# Altium schematic symbol library jlcpcb_2025_04_ferrites_extended_0603.schlib: 833 symbols (part 3 of 4) (continued)
## MAF1608GAD121LTAH0
designator FB?  Impedance @ Frequency: 20Ω@100MHz
Ferrite, 20Ω@100MHz, ±25%, 27mΩ, 3.2A, SMD 0603; Manufacturer: TDK; Manufacturer Part Number: MAF1608GAD121LTAH0; Package Size: 0603; JLCPCB Basic Part: No; JLCPCB Part Number: C2162867; Supplier 1: LCSC; Category: Ferrite Beads; Supplier Part Number 1: C2162867; Tolerance: ±25%; Rated Current: 3.2A; DC Resistance: 27mΩ; RoHS: Yes; ComponentLink1Description: Datasheet; ComponentLink1URL: https://wmsc.lcsc.com/wmsc/upload/file/pdf/v2/lcsc/2304140030_TDK-MAF1608GAD121LTAH0_C2162867.pdf; ComponentLink2Description: JLCPCB Part URL; ComponentLink2URL: https://jlcpcb.com/partdetail/C2162867; ComponentLink3Description: LCSC Part URL; ComponentLink3URL: https://lcsc.com/product-detail/Ferrite-Beads_TDK-TDK-MAF1608GAD121LTAH0_C2162867.html
footprint FB-0603 (0603 (1608M) Ferrite)
pins: 1, 2

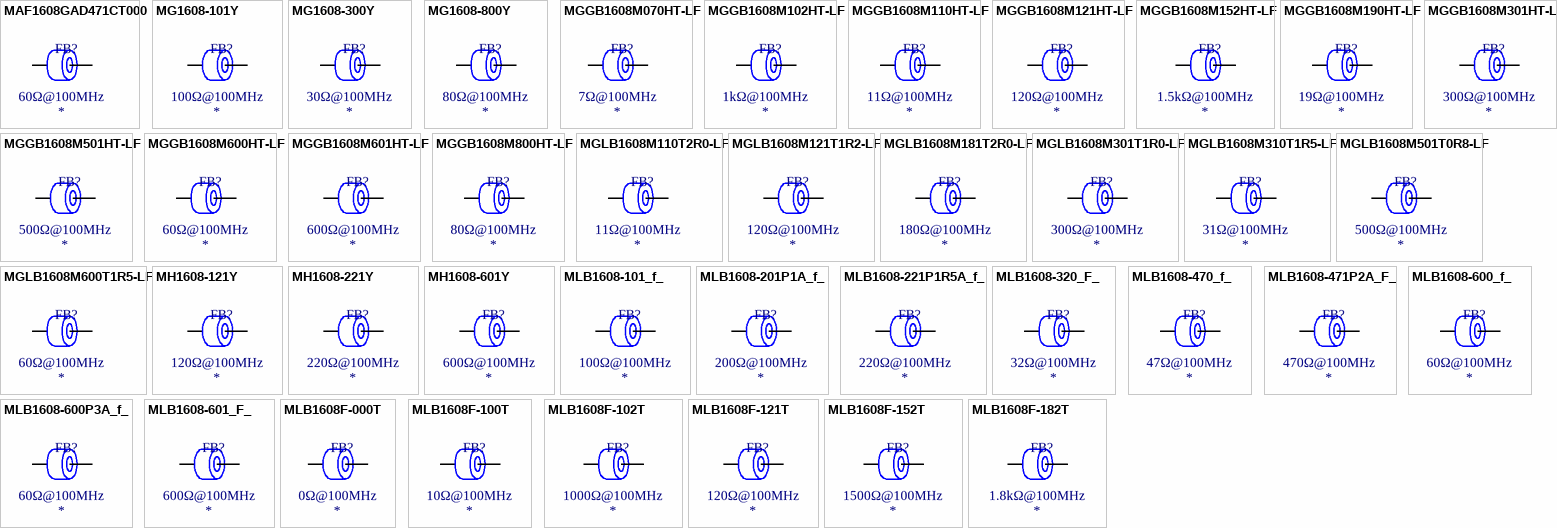
[diagram p13: symbols MAF1608GAD471CT000 to MLB1608F-182T]

## MAF1608GAD471CT000
designator FB?  Impedance @ Frequency: 60Ω@100MHz
Ferrite, 60Ω@100MHz, ±25%, 75mΩ, 1.6A, SMD 0603; Manufacturer: TDK; Manufacturer Part Number: MAF1608GAD471CT000; Package Size: 0603; JLCPCB Basic Part: No; JLCPCB Part Number: C307687; Supplier 1: LCSC; Category: Ferrite Beads; Supplier Part Number 1: C307687; Tolerance: ±25%; Rated Current: 1.6A; DC Resistance: 75mΩ; RoHS: Yes; ComponentLink1Description: Datasheet; ComponentLink1URL: https://wmsc.lcsc.com/wmsc/upload/file/pdf/v2/lcsc/1811131733_TDK-MAF1608GAD471CT000_C307687.pdf; ComponentLink2Description: JLCPCB Part URL; ComponentLink2URL: https://jlcpcb.com/partdetail/C307687; ComponentLink3Description: LCSC Part URL; ComponentLink3URL: https://lcsc.com/product-detail/Ferrite-Beads_TDK-TDK-MAF1608GAD471CT000_C307687.html
footprint FB-0603 (0603 (1608M) Ferrite)
pins: 1, 2

## MG1608-101Y
designator FB?  Impedance @ Frequency: 100Ω@100MHz
Ferrite, 100Ω@100MHz, ±25%, 0.25Ω, 200mA, SMD 0603; Manufacturer: BOURNS; Manufacturer Part Number: MG1608-101Y; Package Size: 0603; JLCPCB Basic Part: No; JLCPCB Part Number: C139459; Supplier 1: LCSC; Category: Ferrite Beads; Supplier Part Number 1: C139459; Tolerance: ±25%; Rated Current: 200mA; DC Resistance: 0.25Ω; RoHS: Yes; ComponentLink1Description: Datasheet; ComponentLink1URL: https://wmsc.lcsc.com/wmsc/upload/file/pdf/v2/lcsc/2304140030_BOURNS-MG1608-101Y_C139459.pdf; ComponentLink2Description: JLCPCB Part URL; ComponentLink2URL: https://jlcpcb.com/partdetail/C139459; ComponentLink3Description: LCSC Part URL; ComponentLink3URL: https://lcsc.com/product-detail/Ferrite-Beads_BOURNS-BOURNS-MG1608-101Y_C139459.html
footprint FB-0603 (0603 (1608M) Ferrite)
pins: 1, 2

## MG1608-300Y
designator FB?  Impedance @ Frequency: 30Ω@100MHz
Ferrite, 30Ω@100MHz, ±25%, 0.2Ω, 200mA, SMD 0603; Manufacturer: BOURNS; Manufacturer Part Number: MG1608-300Y; Package Size: 0603; JLCPCB Basic Part: No; JLCPCB Part Number: C139460; Supplier 1: LCSC; Category: Ferrite Beads; Supplier Part Number 1: C139460; Tolerance: ±25%; Rated Current: 200mA; DC Resistance: 0.2Ω; RoHS: Yes; ComponentLink1Description: Datasheet; ComponentLink1URL: https://wmsc.lcsc.com/wmsc/upload/file/pdf/v2/lcsc/2304140030_BOURNS-MG1608-300Y_C139460.pdf; ComponentLink2Description: JLCPCB Part URL; ComponentLink2URL: https://jlcpcb.com/partdetail/C139460; ComponentLink3Description: LCSC Part URL; ComponentLink3URL: https://lcsc.com/product-detail/Ferrite-Beads_BOURNS-BOURNS-MG1608-300Y_C139460.html
footprint FB-0603 (0603 (1608M) Ferrite)
pins: 1, 2

## MG1608-800Y
designator FB?  Impedance @ Frequency: 80Ω@100MHz
Ferrite, 80Ω@100MHz, ±25%, 0.3Ω, 300mA, SMD 0603; Manufacturer: BOURNS; Manufacturer Part Number: MG1608-800Y; Package Size: 0603; JLCPCB Basic Part: No; JLCPCB Part Number: C139461; Supplier 1: LCSC; Category: Ferrite Beads; Supplier Part Number 1: C139461; Tolerance: ±25%; Rated Current: 300mA; DC Resistance: 0.3Ω; RoHS: Yes; ComponentLink1Description: Datasheet; ComponentLink1URL: https://wmsc.lcsc.com/wmsc/upload/file/pdf/v2/lcsc/2304140030_BOURNS-MG1608-800Y_C139461.pdf; ComponentLink2Description: JLCPCB Part URL; ComponentLink2URL: https://jlcpcb.com/partdetail/C139461; ComponentLink3Description: LCSC Part URL; ComponentLink3URL: https://lcsc.com/product-detail/Ferrite-Beads_BOURNS-BOURNS-MG1608-800Y_C139461.html
footprint FB-0603 (0603 (1608M) Ferrite)
pins: 1, 2

## MGGB1608M070HT-LF
designator FB?  Impedance @ Frequency: 7Ω@100MHz
Ferrite, 7Ω@100MHz, ±25%, 0.05Ω, 1000mA, SMD 0603; Manufacturer: microgate; Manufacturer Part Number: MGGB1608M070HT-LF; Package Size: 0603; JLCPCB Basic Part: No; JLCPCB Part Number: C281138; Supplier 1: LCSC; Category: Ferrite Beads; Supplier Part Number 1: C281138; Tolerance: ±25%; Rated Current: 1000mA; DC Resistance: 0.05Ω; RoHS: Yes; ComponentLink1Description: Datasheet; ComponentLink1URL: https://wmsc.lcsc.com/wmsc/upload/file/pdf/v2/lcsc/2304140030_microgate-MGGB1608M070HT-LF_C281138.pdf; ComponentLink2Description: JLCPCB Part URL; ComponentLink2URL: https://jlcpcb.com/partdetail/C281138; ComponentLink3Description: LCSC Part URL; ComponentLink3URL: https://lcsc.com/product-detail/Ferrite-Beads_microgate-microgate-MGGB1608M070HT-LF_C281138.html
footprint FB-0603 (0603 (1608M) Ferrite)
pins: 1, 2

## MGGB1608M102HT-LF
designator FB?  Impedance @ Frequency: 1kΩ@100MHz
Ferrite, 1kΩ@100MHz, ±25%, 0.6Ω, 100mA, SMD 0603; Manufacturer: microgate; Manufacturer Part Number: MGGB1608M102HT-LF; Package Size: 0603; JLCPCB Basic Part: No; JLCPCB Part Number: C281139; Supplier 1: LCSC; Category: Ferrite Beads; Supplier Part Number 1: C281139; Tolerance: ±25%; Rated Current: 100mA; DC Resistance: 0.6Ω; RoHS: Yes; ComponentLink1Description: Datasheet; ComponentLink1URL: https://wmsc.lcsc.com/wmsc/upload/file/pdf/v2/lcsc/2304140030_microgate-MGGB1608M102HT-LF_C281139.pdf; ComponentLink2Description: JLCPCB Part URL; ComponentLink2URL: https://jlcpcb.com/partdetail/C281139; ComponentLink3Description: LCSC Part URL; ComponentLink3URL: https://lcsc.com/product-detail/Ferrite-Beads_microgate-microgate-MGGB1608M102HT-LF_C281139.html
footprint FB-0603 (0603 (1608M) Ferrite)
pins: 1, 2

## MGGB1608M110HT-LF
designator FB?  Impedance @ Frequency: 11Ω@100MHz
Ferrite, 11Ω@100MHz, ±25%, 0.05Ω, 1000mA, SMD 0603; Manufacturer: microgate; Manufacturer Part Number: MGGB1608M110HT-LF; Package Size: 0603; JLCPCB Basic Part: No; JLCPCB Part Number: C281140; Supplier 1: LCSC; Category: Ferrite Beads; Supplier Part Number 1: C281140; Tolerance: ±25%; Rated Current: 1000mA; DC Resistance: 0.05Ω; RoHS: Yes; ComponentLink1Description: Datasheet; ComponentLink1URL: https://wmsc.lcsc.com/wmsc/upload/file/pdf/v2/lcsc/2304140030_microgate-MGGB1608M110HT-LF_C281140.pdf; ComponentLink2Description: JLCPCB Part URL; ComponentLink2URL: https://jlcpcb.com/partdetail/C281140; ComponentLink3Description: LCSC Part URL; ComponentLink3URL: https://lcsc.com/product-detail/Ferrite-Beads_microgate-microgate-MGGB1608M110HT-LF_C281140.html
footprint FB-0603 (0603 (1608M) Ferrite)
pins: 1, 2

## MGGB1608M121HT-LF
designator FB?  Impedance @ Frequency: 120Ω@100MHz
Ferrite, 120Ω@100MHz, ±25%, 0.2Ω, 200mA, SMD 0603; Manufacturer: microgate; Manufacturer Part Number: MGGB1608M121HT-LF; Package Size: 0603; JLCPCB Basic Part: No; JLCPCB Part Number: C281141; Supplier 1: LCSC; Category: Ferrite Beads; Supplier Part Number 1: C281141; Tolerance: ±25%; Rated Current: 200mA; DC Resistance: 0.2Ω; RoHS: Yes; ComponentLink1Description: Datasheet; ComponentLink1URL: https://wmsc.lcsc.com/wmsc/upload/file/pdf/v2/lcsc/2304140030_microgate-MGGB1608M121HT-LF_C281141.pdf; ComponentLink2Description: JLCPCB Part URL; ComponentLink2URL: https://jlcpcb.com/partdetail/C281141; ComponentLink3Description: LCSC Part URL; ComponentLink3URL: https://lcsc.com/product-detail/Ferrite-Beads_microgate-microgate-MGGB1608M121HT-LF_C281141.html
footprint FB-0603 (0603 (1608M) Ferrite)
pins: 1, 2

## MGGB1608M152HT-LF
designator FB?  Impedance @ Frequency: 1.5kΩ@100MHz
Ferrite, 1.5kΩ@100MHz, ±25%, 0.8Ω, 100mA, SMD 0603; Manufacturer: microgate; Manufacturer Part Number: MGGB1608M152HT-LF; Package Size: 0603; JLCPCB Basic Part: No; JLCPCB Part Number: C281142; Supplier 1: LCSC; Category: Ferrite Beads; Supplier Part Number 1: C281142; Tolerance: ±25%; Rated Current: 100mA; DC Resistance: 0.8Ω; RoHS: Yes; ComponentLink1Description: Datasheet; ComponentLink1URL: https://wmsc.lcsc.com/wmsc/upload/file/pdf/v2/lcsc/2304140030_microgate-MGGB1608M152HT-LF_C281142.pdf; ComponentLink2Description: JLCPCB Part URL; ComponentLink2URL: https://jlcpcb.com/partdetail/C281142; ComponentLink3Description: LCSC Part URL; ComponentLink3URL: https://lcsc.com/product-detail/Ferrite-Beads_microgate-microgate-MGGB1608M152HT-LF_C281142.html
footprint FB-0603 (0603 (1608M) Ferrite)
pins: 1, 2

## MGGB1608M190HT-LF
designator FB?  Impedance @ Frequency: 19Ω@100MHz
Ferrite, 19Ω@100MHz, ±25%, 0.05Ω, 1000mA, SMD 0603; Manufacturer: microgate; Manufacturer Part Number: MGGB1608M190HT-LF; Package Size: 0603; JLCPCB Basic Part: No; JLCPCB Part Number: C281144; Supplier 1: LCSC; Category: Ferrite Beads; Supplier Part Number 1: C281144; Tolerance: ±25%; Rated Current: 1000mA; DC Resistance: 0.05Ω; RoHS: Yes; ComponentLink1Description: Datasheet; ComponentLink1URL: https://wmsc.lcsc.com/wmsc/upload/file/pdf/v2/lcsc/2304140030_microgate-MGGB1608M190HT-LF_C281144.pdf; ComponentLink2Description: JLCPCB Part URL; ComponentLink2URL: https://jlcpcb.com/partdetail/C281144; ComponentLink3Description: LCSC Part URL; ComponentLink3URL: https://lcsc.com/product-detail/Ferrite-Beads_microgate-microgate-MGGB1608M190HT-LF_C281144.html
footprint FB-0603 (0603 (1608M) Ferrite)
pins: 1, 2

## MGGB1608M301HT-LF
designator FB?  Impedance @ Frequency: 300Ω@100MHz
Ferrite, 300Ω@100MHz, ±25%, 0.35Ω, 200mA, SMD 0603; Manufacturer: microgate; Manufacturer Part Number: MGGB1608M301HT-LF; Package Size: 0603; JLCPCB Basic Part: No; JLCPCB Part Number: C281148; Supplier 1: LCSC; Category: Ferrite Beads; Supplier Part Number 1: C281148; Tolerance: ±25%; Rated Current: 200mA; DC Resistance: 0.35Ω; RoHS: Yes; ComponentLink1Description: Datasheet; ComponentLink1URL: https://wmsc.lcsc.com/wmsc/upload/file/pdf/v2/lcsc/2304140030_microgate-MGGB1608M301HT-LF_C281148.pdf; ComponentLink2Description: JLCPCB Part URL; ComponentLink2URL: https://jlcpcb.com/partdetail/C281148; ComponentLink3Description: LCSC Part URL; ComponentLink3URL: https://lcsc.com/product-detail/Ferrite-Beads_microgate-microgate-MGGB1608M301HT-LF_C281148.html
footprint FB-0603 (0603 (1608M) Ferrite)
pins: 1, 2

## MGGB1608M501HT-LF
designator FB?  Impedance @ Frequency: 500Ω@100MHz
Ferrite, 500Ω@100MHz, ±25%, SMD 0603; Manufacturer: microgate; Manufacturer Part Number: MGGB1608M501HT-LF; Package Size: 0603; JLCPCB Basic Part: No; JLCPCB Part Number: C281149; Supplier 1: LCSC; Category: Ferrite Beads; Supplier Part Number 1: C281149; Tolerance: ±25%; RoHS: Yes; ComponentLink1Description: Datasheet; ComponentLink1URL: https://wmsc.lcsc.com/wmsc/upload/file/pdf/v2/lcsc/2304140030_microgate-MGGB1608M501HT-LF_C281149.pdf; ComponentLink2Description: JLCPCB Part URL; ComponentLink2URL: https://jlcpcb.com/partdetail/C281149; ComponentLink3Description: LCSC Part URL; ComponentLink3URL: https://lcsc.com/product-detail/Ferrite-Beads_microgate-microgate-MGGB1608M501HT-LF_C281149.html
pins: 1, 2

## MGGB1608M600HT-LF
designator FB?  Impedance @ Frequency: 60Ω@100MHz
Ferrite, 60Ω@100MHz, ±25%, 0.12Ω, 300mA, SMD 0603; Manufacturer: microgate; Manufacturer Part Number: MGGB1608M600HT-LF; Package Size: 0603; JLCPCB Basic Part: No; JLCPCB Part Number: C281150; Supplier 1: LCSC; Category: Ferrite Beads; Supplier Part Number 1: C281150; Tolerance: ±25%; Rated Current: 300mA; DC Resistance: 0.12Ω; RoHS: Yes; ComponentLink1Description: Datasheet; ComponentLink1URL: https://wmsc.lcsc.com/wmsc/upload/file/pdf/v2/lcsc/2304140030_microgate-MGGB1608M600HT-LF_C281150.pdf; ComponentLink2Description: JLCPCB Part URL; ComponentLink2URL: https://jlcpcb.com/partdetail/C281150; ComponentLink3Description: LCSC Part URL; ComponentLink3URL: https://lcsc.com/product-detail/Ferrite-Beads_microgate-microgate-MGGB1608M600HT-LF_C281150.html
footprint FB-0603 (0603 (1608M) Ferrite)
pins: 1, 2

## MGGB1608M601HT-LF
designator FB?  Impedance @ Frequency: 600Ω@100MHz
Ferrite, 600Ω@100MHz, ±25%, 0.5Ω, 200mA, SMD 0603; Manufacturer: microgate; Manufacturer Part Number: MGGB1608M601HT-LF; Package Size: 0603; JLCPCB Basic Part: No; JLCPCB Part Number: C281151; Supplier 1: LCSC; Category: Ferrite Beads; Supplier Part Number 1: C281151; Tolerance: ±25%; Rated Current: 200mA; DC Resistance: 0.5Ω; RoHS: Yes; ComponentLink1Description: Datasheet; ComponentLink1URL: https://wmsc.lcsc.com/wmsc/upload/file/pdf/v2/lcsc/2304140030_microgate-MGGB1608M601HT-LF_C281151.pdf; ComponentLink2Description: JLCPCB Part URL; ComponentLink2URL: https://jlcpcb.com/partdetail/C281151; ComponentLink3Description: LCSC Part URL; ComponentLink3URL: https://lcsc.com/product-detail/Ferrite-Beads_microgate-microgate-MGGB1608M601HT-LF_C281151.html
footprint FB-0603 (0603 (1608M) Ferrite)
pins: 1, 2

## MGGB1608M800HT-LF
designator FB?  Impedance @ Frequency: 80Ω@100MHz
Ferrite, 80Ω@100MHz, ±25%, 0.16Ω, 200mA, SMD 0603; Manufacturer: microgate; Manufacturer Part Number: MGGB1608M800HT-LF; Package Size: 0603; JLCPCB Basic Part: No; JLCPCB Part Number: C281152; Supplier 1: LCSC; Category: Ferrite Beads; Supplier Part Number 1: C281152; Tolerance: ±25%; Rated Current: 200mA; DC Resistance: 0.16Ω; RoHS: Yes; ComponentLink1Description: Datasheet; ComponentLink1URL: https://wmsc.lcsc.com/wmsc/upload/file/pdf/v2/lcsc/2304140030_microgate-MGGB1608M800HT-LF_C281152.pdf; ComponentLink2Description: JLCPCB Part URL; ComponentLink2URL: https://jlcpcb.com/partdetail/C281152; ComponentLink3Description: LCSC Part URL; ComponentLink3URL: https://lcsc.com/product-detail/Ferrite-Beads_microgate-microgate-MGGB1608M800HT-LF_C281152.html
footprint FB-0603 (0603 (1608M) Ferrite)
pins: 1, 2

## MGLB1608M110T2R0-LF
designator FB?  Impedance @ Frequency: 11Ω@100MHz
Ferrite, 11Ω@100MHz, ±25%, 30mΩ, 2A, SMD 0603; Manufacturer: microgate; Manufacturer Part Number: MGLB1608M110T2R0-LF; Package Size: 0603; JLCPCB Basic Part: No; JLCPCB Part Number: C281201; Supplier 1: LCSC; Category: Ferrite Beads; Supplier Part Number 1: C281201; Tolerance: ±25%; Rated Current: 2A; DC Resistance: 30mΩ; RoHS: Yes; ComponentLink1Description: Datasheet; ComponentLink1URL: https://wmsc.lcsc.com/wmsc/upload/file/pdf/v2/lcsc/2304140030_microgate-MGLB1608M110T2R0-LF_C281201.pdf; ComponentLink2Description: JLCPCB Part URL; ComponentLink2URL: https://jlcpcb.com/partdetail/C281201; ComponentLink3Description: LCSC Part URL; ComponentLink3URL: https://lcsc.com/product-detail/Ferrite-Beads_microgate-microgate-MGLB1608M110T2R0-LF_C281201.html
footprint FB-0603 (0603 (1608M) Ferrite)
pins: 1, 2

## MGLB1608M121T1R2-LF
designator FB?  Impedance @ Frequency: 120Ω@100MHz
Ferrite, 120Ω@100MHz, ±25%, 100mΩ, 1.2A, SMD 0603; Manufacturer: microgate; Manufacturer Part Number: MGLB1608M121T1R2-LF; Package Size: 0603; JLCPCB Basic Part: No; JLCPCB Part Number: C281202; Supplier 1: LCSC; Category: Ferrite Beads; Supplier Part Number 1: C281202; Tolerance: ±25%; Rated Current: 1.2A; DC Resistance: 100mΩ; RoHS: Yes; ComponentLink1Description: Datasheet; ComponentLink1URL: https://wmsc.lcsc.com/wmsc/upload/file/pdf/v2/lcsc/2304140030_microgate-MGLB1608M121T1R2-LF_C281202.pdf; ComponentLink2Description: JLCPCB Part URL; ComponentLink2URL: https://jlcpcb.com/partdetail/C281202; ComponentLink3Description: LCSC Part URL; ComponentLink3URL: https://lcsc.com/product-detail/Ferrite-Beads_microgate-microgate-MGLB1608M121T1R2-LF_C281202.html
footprint FB-0603 (0603 (1608M) Ferrite)
pins: 1, 2

## MGLB1608M181T2R0-LF
designator FB?  Impedance @ Frequency: 180Ω@100MHz
Ferrite, 180Ω@100MHz, ±25%, 2A, SMD 0603; Manufacturer: microgate; Manufacturer Part Number: MGLB1608M181T2R0-LF; Package Size: 0603; JLCPCB Basic Part: No; JLCPCB Part Number: C281203; Supplier 1: LCSC; Category: Ferrite Beads; Supplier Part Number 1: C281203; Tolerance: ±25%; Rated Current: 2A; RoHS: Yes; ComponentLink1Description: Datasheet; ComponentLink1URL: https://wmsc.lcsc.com/wmsc/upload/file/pdf/v2/lcsc/2304140030_microgate-MGLB1608M181T2R0-LF_C281203.pdf; ComponentLink2Description: JLCPCB Part URL; ComponentLink2URL: https://jlcpcb.com/partdetail/C281203; ComponentLink3Description: LCSC Part URL; ComponentLink3URL: https://lcsc.com/product-detail/Ferrite-Beads_microgate-microgate-MGLB1608M181T2R0-LF_C281203.html
pins: 1, 2

## MGLB1608M301T1R0-LF
designator FB?  Impedance @ Frequency: 300Ω@100MHz
Ferrite, 300Ω@100MHz, ±25%, 200mΩ, 1A, SMD 0603; Manufacturer: microgate; Manufacturer Part Number: MGLB1608M301T1R0-LF; Package Size: 0603; JLCPCB Basic Part: No; JLCPCB Part Number: C281205; Supplier 1: LCSC; Category: Ferrite Beads; Supplier Part Number 1: C281205; Tolerance: ±25%; Rated Current: 1A; DC Resistance: 200mΩ; RoHS: Yes; ComponentLink1Description: Datasheet; ComponentLink1URL: https://wmsc.lcsc.com/wmsc/upload/file/pdf/v2/lcsc/2304140030_microgate-MGLB1608M301T1R0-LF_C281205.pdf; ComponentLink2Description: JLCPCB Part URL; ComponentLink2URL: https://jlcpcb.com/partdetail/C281205; ComponentLink3Description: LCSC Part URL; ComponentLink3URL: https://lcsc.com/product-detail/Ferrite-Beads_microgate-microgate-MGLB1608M301T1R0-LF_C281205.html
footprint FB-0603 (0603 (1608M) Ferrite)
pins: 1, 2

## MGLB1608M310T1R5-LF
designator FB?  Impedance @ Frequency: 31Ω@100MHz
Ferrite, 31Ω@100MHz, ±25%, 50mΩ, 1.5A, SMD 0603; Manufacturer: microgate; Manufacturer Part Number: MGLB1608M310T1R5-LF; Package Size: 0603; JLCPCB Basic Part: No; JLCPCB Part Number: C281206; Supplier 1: LCSC; Category: Ferrite Beads; Supplier Part Number 1: C281206; Tolerance: ±25%; Rated Current: 1.5A; DC Resistance: 50mΩ; RoHS: Yes; ComponentLink1Description: Datasheet; ComponentLink1URL: https://wmsc.lcsc.com/wmsc/upload/file/pdf/v2/lcsc/2304140030_microgate-MGLB1608M310T1R5-LF_C281206.pdf; ComponentLink2Description: JLCPCB Part URL; ComponentLink2URL: https://jlcpcb.com/partdetail/C281206; ComponentLink3Description: LCSC Part URL; ComponentLink3URL: https://lcsc.com/product-detail/Ferrite-Beads_microgate-microgate-MGLB1608M310T1R5-LF_C281206.html
footprint FB-0603 (0603 (1608M) Ferrite)
pins: 1, 2

## MGLB1608M501T0R8-LF
designator FB?  Impedance @ Frequency: 500Ω@100MHz
Ferrite, 500Ω@100MHz, ±25%, 280mΩ, 800mA, SMD 0603; Manufacturer: microgate; Manufacturer Part Number: MGLB1608M501T0R8-LF; Package Size: 0603; JLCPCB Basic Part: No; JLCPCB Part Number: C281207; Supplier 1: LCSC; Category: Ferrite Beads; Supplier Part Number 1: C281207; Tolerance: ±25%; Rated Current: 800mA; DC Resistance: 280mΩ; RoHS: Yes; ComponentLink1Description: Datasheet; ComponentLink1URL: https://wmsc.lcsc.com/wmsc/upload/file/pdf/v2/lcsc/2304140030_microgate-MGLB1608M501T0R8-LF_C281207.pdf; ComponentLink2Description: JLCPCB Part URL; ComponentLink2URL: https://jlcpcb.com/partdetail/C281207; ComponentLink3Description: LCSC Part URL; ComponentLink3URL: https://lcsc.com/product-detail/Ferrite-Beads_microgate-microgate-MGLB1608M501T0R8-LF_C281207.html
footprint FB-0603 (0603 (1608M) Ferrite)
pins: 1, 2

## MGLB1608M600T1R5-LF
designator FB?  Impedance @ Frequency: 60Ω@100MHz
Ferrite, 60Ω@100MHz, ±25%, 80mΩ, 1.5A, SMD 0603; Manufacturer: microgate; Manufacturer Part Number: MGLB1608M600T1R5-LF; Package Size: 0603; JLCPCB Basic Part: No; JLCPCB Part Number: C281208; Supplier 1: LCSC; Category: Ferrite Beads; Supplier Part Number 1: C281208; Tolerance: ±25%; Rated Current: 1.5A; DC Resistance: 80mΩ; RoHS: Yes; ComponentLink1Description: Datasheet; ComponentLink1URL: https://wmsc.lcsc.com/wmsc/upload/file/pdf/v2/lcsc/2304140030_microgate-MGLB1608M600T1R5-LF_C281208.pdf; ComponentLink2Description: JLCPCB Part URL; ComponentLink2URL: https://jlcpcb.com/partdetail/C281208; ComponentLink3Description: LCSC Part URL; ComponentLink3URL: https://lcsc.com/product-detail/Ferrite-Beads_microgate-microgate-MGLB1608M600T1R5-LF_C281208.html
footprint FB-0603 (0603 (1608M) Ferrite)
pins: 1, 2

## MH1608-121Y
designator FB?  Impedance @ Frequency: 120Ω@100MHz
Ferrite, 120Ω@100MHz, ±25%, 100mΩ, 2A, SMD 0603; Manufacturer: BOURNS; Manufacturer Part Number: MH1608-121Y; Package Size: 0603; JLCPCB Basic Part: No; JLCPCB Part Number: C2650949; Supplier 1: LCSC; Category: Ferrite Beads; Supplier Part Number 1: C2650949; Tolerance: ±25%; Rated Current: 2A; DC Resistance: 100mΩ; RoHS: Yes; ComponentLink1Description: Datasheet; ComponentLink1URL: https://wmsc.lcsc.com/wmsc/upload/file/pdf/v2/lcsc/2304140030_BOURNS-MH1608-121Y_C2650949.pdf; ComponentLink2Description: JLCPCB Part URL; ComponentLink2URL: https://jlcpcb.com/partdetail/C2650949; ComponentLink3Description: LCSC Part URL; ComponentLink3URL: https://lcsc.com/product-detail/Ferrite-Beads_BOURNS-BOURNS-MH1608-121Y_C2650949.html
footprint FB-0603 (0603 (1608M) Ferrite)
pins: 1, 2

## MH1608-221Y
designator FB?  Impedance @ Frequency: 220Ω@100MHz
Ferrite, 220Ω@100MHz, ±25%, 100mΩ, 2A, SMD 0603; Manufacturer: BOURNS; Manufacturer Part Number: MH1608-221Y; Package Size: 0603; JLCPCB Basic Part: No; JLCPCB Part Number: C780187; Supplier 1: LCSC; Category: Ferrite Beads; Supplier Part Number 1: C780187; Tolerance: ±25%; Rated Current: 2A; DC Resistance: 100mΩ; RoHS: Yes; ComponentLink1Description: Datasheet; ComponentLink1URL: https://wmsc.lcsc.com/wmsc/upload/file/pdf/v2/lcsc/2304140030_BOURNS-MH1608-221Y_C780187.pdf; ComponentLink2Description: JLCPCB Part URL; ComponentLink2URL: https://jlcpcb.com/partdetail/C780187; ComponentLink3Description: LCSC Part URL; ComponentLink3URL: https://lcsc.com/product-detail/Ferrite-Beads_BOURNS-BOURNS-MH1608-221Y_C780187.html
footprint FB-0603 (0603 (1608M) Ferrite)
pins: 1, 2

## MH1608-601Y
designator FB?  Impedance @ Frequency: 600Ω@100MHz
Ferrite, 600Ω@100MHz, ±25%, 200mΩ, 1A, SMD 0603; Manufacturer: BOURNS; Manufacturer Part Number: MH1608-601Y; Package Size: 0603; JLCPCB Basic Part: No; JLCPCB Part Number: C780186; Supplier 1: LCSC; Category: Ferrite Beads; Supplier Part Number 1: C780186; Tolerance: ±25%; Rated Current: 1A; DC Resistance: 200mΩ; RoHS: Yes; ComponentLink1Description: Datasheet; ComponentLink1URL: https://wmsc.lcsc.com/wmsc/upload/file/pdf/v2/lcsc/2304140030_BOURNS-MH1608-601Y_C780186.pdf; ComponentLink2Description: JLCPCB Part URL; ComponentLink2URL: https://jlcpcb.com/partdetail/C780186; ComponentLink3Description: LCSC Part URL; ComponentLink3URL: https://lcsc.com/product-detail/Ferrite-Beads_BOURNS-BOURNS-MH1608-601Y_C780186.html
footprint FB-0603 (0603 (1608M) Ferrite)
pins: 1, 2

## MLB1608-101_f_
designator FB?  Impedance @ Frequency: 100Ω@100MHz
Ferrite, 100Ω@100MHz, ±25%, 200mΩ, 300mA, SMD 0603; Manufacturer: Meled; Manufacturer Part Number: MLB1608-101(f); Package Size: 0603; JLCPCB Basic Part: No; JLCPCB Part Number: C8220; Supplier 1: LCSC; Category: Ferrite Beads; Supplier Part Number 1: C8220; Tolerance: ±25%; Rated Current: 300mA; DC Resistance: 200mΩ; RoHS: Yes; ComponentLink1Description: Datasheet; ComponentLink1URL: https://wmsc.lcsc.com/wmsc/upload/file/pdf/v2/lcsc/1811111110_MetalLions-MLB1608-101-f_C8220.pdf; ComponentLink2Description: JLCPCB Part URL; ComponentLink2URL: https://jlcpcb.com/partdetail/C8220; ComponentLink3Description: LCSC Part URL; ComponentLink3URL: https://lcsc.com/product-detail/Ferrite-Beads_Meled-Meled-MLB1608-101f_C8220.html
footprint FB-0603 (0603 (1608M) Ferrite)
pins: 1, 2

## MLB1608-201P1A_f_
designator FB?  Impedance @ Frequency: 200Ω@100MHz
Ferrite, 200Ω@100MHz, ±25%, 300mΩ, 1A, SMD 0603; Manufacturer: Meled; Manufacturer Part Number: MLB1608-201P1A(f); Package Size: 0603; JLCPCB Basic Part: No; JLCPCB Part Number: C45316; Supplier 1: LCSC; Category: Ferrite Beads; Supplier Part Number 1: C45316; Tolerance: ±25%; Rated Current: 1A; DC Resistance: 300mΩ; RoHS: Yes; ComponentLink1Description: Datasheet; ComponentLink1URL: https://wmsc.lcsc.com/wmsc/upload/file/pdf/v2/lcsc/1809191819_MetalLions-MLB1608-201P1A-f_C45316.pdf; ComponentLink2Description: JLCPCB Part URL; ComponentLink2URL: https://jlcpcb.com/partdetail/C45316; ComponentLink3Description: LCSC Part URL; ComponentLink3URL: https://lcsc.com/product-detail/Ferrite-Beads_Meled-Meled-MLB1608-201P1Af_C45316.html
footprint FB-0603 (0603 (1608M) Ferrite)
pins: 1, 2

## MLB1608-221P1R5A_f_
designator FB?  Impedance @ Frequency: 220Ω@100MHz
Ferrite, 220Ω@100MHz, ±25%, 100mΩ, 1.5A, SMD 0603; Manufacturer: Meled; Manufacturer Part Number: MLB1608-221P1R5A(f); Package Size: 0603; JLCPCB Basic Part: No; JLCPCB Part Number: C47131; Supplier 1: LCSC; Category: Ferrite Beads; Supplier Part Number 1: C47131; Tolerance: ±25%; Rated Current: 1.5A; DC Resistance: 100mΩ; RoHS: Yes; ComponentLink1Description: Datasheet; ComponentLink1URL: https://wmsc.lcsc.com/wmsc/upload/file/pdf/v2/lcsc/1809191911_MetalLions-MLB1608-221P1R5A-f_C47131.pdf; ComponentLink2Description: JLCPCB Part URL; ComponentLink2URL: https://jlcpcb.com/partdetail/C47131; ComponentLink3Description: LCSC Part URL; ComponentLink3URL: https://lcsc.com/product-detail/Ferrite-Beads_Meled-Meled-MLB1608-221P1R5Af_C47131.html
footprint FB-0603 (0603 (1608M) Ferrite)
pins: 1, 2

## MLB1608-320_F_
designator FB?  Impedance @ Frequency: 32Ω@100MHz
Ferrite, 32Ω@100MHz, ±25%, 50mΩ, 500mA, SMD 0603; Manufacturer: Meled; Manufacturer Part Number: MLB1608-320(F); Package Size: 0603; JLCPCB Basic Part: No; JLCPCB Part Number: C24589; Supplier 1: LCSC; Category: Ferrite Beads; Supplier Part Number 1: C24589; Tolerance: ±25%; Rated Current: 500mA; DC Resistance: 50mΩ; RoHS: Yes; ComponentLink1Description: Datasheet; ComponentLink1URL: https://wmsc.lcsc.com/wmsc/upload/file/pdf/v2/lcsc/1809140110_MetalLions-MLB1608-320-F_C24589.pdf; ComponentLink2Description: JLCPCB Part URL; ComponentLink2URL: https://jlcpcb.com/partdetail/C24589; ComponentLink3Description: LCSC Part URL; ComponentLink3URL: https://lcsc.com/product-detail/Ferrite-Beads_Meled-Meled-MLB1608-320F_C24589.html
footprint FB-0603 (0603 (1608M) Ferrite)
pins: 1, 2

## MLB1608-470_f_
designator FB?  Impedance @ Frequency: 47Ω@100MHz
Ferrite, 47Ω@100MHz, ±25%, 50mΩ, 500mA, SMD 0603; Manufacturer: Meled; Manufacturer Part Number: MLB1608-470(f); Package Size: 0603; JLCPCB Basic Part: No; JLCPCB Part Number: C53139; Supplier 1: LCSC; Category: Ferrite Beads; Supplier Part Number 1: C53139; Tolerance: ±25%; Rated Current: 500mA; DC Resistance: 50mΩ; RoHS: Yes; ComponentLink1Description: Datasheet; ComponentLink1URL: https://wmsc.lcsc.com/wmsc/upload/file/pdf/v2/lcsc/1809140010_MetalLions-MLB1608-470-f_C53139.pdf; ComponentLink2Description: JLCPCB Part URL; ComponentLink2URL: https://jlcpcb.com/partdetail/C53139; ComponentLink3Description: LCSC Part URL; ComponentLink3URL: https://lcsc.com/product-detail/Ferrite-Beads_Meled-Meled-MLB1608-470f-_C53139.html
footprint FB-0603 (0603 (1608M) Ferrite)
pins: 1, 2

## MLB1608-471P2A_F_
designator FB?  Impedance @ Frequency: 470Ω@100MHz
Ferrite, 470Ω@100MHz, ±25%, 450mΩ, 2A, SMD 0603; Manufacturer: Meled; Manufacturer Part Number: MLB1608-471P2A(F); Package Size: 0603; JLCPCB Basic Part: No; JLCPCB Part Number: C24705; Supplier 1: LCSC; Category: Ferrite Beads; Supplier Part Number 1: C24705; Tolerance: ±25%; Rated Current: 2A; DC Resistance: 450mΩ; RoHS: Yes; ComponentLink1Description: Datasheet; ComponentLink1URL: https://wmsc.lcsc.com/wmsc/upload/file/pdf/v2/lcsc/1809301812_MetalLions-MLB1608-471P2A-F_C24705.pdf; ComponentLink2Description: JLCPCB Part URL; ComponentLink2URL: https://jlcpcb.com/partdetail/C24705; ComponentLink3Description: LCSC Part URL; ComponentLink3URL: https://lcsc.com/product-detail/Ferrite-Beads_Meled-Meled-MLB1608-471P2AF_C24705.html
footprint FB-0603 (0603 (1608M) Ferrite)
pins: 1, 2

## MLB1608-600_f_
designator FB?  Impedance @ Frequency: 60Ω@100MHz
Ferrite, 60Ω@100MHz, ±25%, 80mΩ, 500mA, SMD 0603; Manufacturer: Meled; Manufacturer Part Number: MLB1608-600(f); Package Size: 0603; JLCPCB Basic Part: No; JLCPCB Part Number: C46786; Supplier 1: LCSC; Category: Ferrite Beads; Supplier Part Number 1: C46786; Tolerance: ±25%; Rated Current: 500mA; DC Resistance: 80mΩ; RoHS: Yes; ComponentLink1Description: Datasheet; ComponentLink1URL: https://wmsc.lcsc.com/wmsc/upload/file/pdf/v2/lcsc/1809140032_MetalLions-MLB1608-600-f_C46786.pdf; ComponentLink2Description: JLCPCB Part URL; ComponentLink2URL: https://jlcpcb.com/partdetail/C46786; ComponentLink3Description: LCSC Part URL; ComponentLink3URL: https://lcsc.com/product-detail/Ferrite-Beads_Meled-Meled-MLB1608-600f_C46786.html
footprint FB-0603 (0603 (1608M) Ferrite)
pins: 1, 2

## MLB1608-600P3A_f_
designator FB?  Impedance @ Frequency: 60Ω@100MHz
Ferrite, 60Ω@100MHz, ±25%, 80mΩ, 3A, SMD 0603; Manufacturer: Meled; Manufacturer Part Number: MLB1608-600P3A(f); Package Size: 0603; JLCPCB Basic Part: No; JLCPCB Part Number: C52283; Supplier 1: LCSC; Category: Ferrite Beads; Supplier Part Number 1: C52283; Tolerance: ±25%; Rated Current: 3A; DC Resistance: 80mΩ; RoHS: Yes; ComponentLink1Description: Datasheet; ComponentLink1URL: https://wmsc.lcsc.com/wmsc/upload/file/pdf/v2/lcsc/1809212124_MetalLions-MLB1608-600P3A-f_C52283.pdf; ComponentLink2Description: JLCPCB Part URL; ComponentLink2URL: https://jlcpcb.com/partdetail/C52283; ComponentLink3Description: LCSC Part URL; ComponentLink3URL: https://lcsc.com/product-detail/Ferrite-Beads_Meled-Meled-MLB1608-600P3Af-_C52283.html
footprint FB-0603 (0603 (1608M) Ferrite)
pins: 1, 2

## MLB1608-601_F_
designator FB?  Impedance @ Frequency: 600Ω@100MHz
Ferrite, 600Ω@100MHz, ±25%, 450mΩ, 200mA, SMD 0603; Manufacturer: Meled; Manufacturer Part Number: MLB1608-601(F); Package Size: 0603; JLCPCB Basic Part: No; JLCPCB Part Number: C29108; Supplier 1: LCSC; Category: Ferrite Beads; Supplier Part Number 1: C29108; Tolerance: ±25%; Rated Current: 200mA; DC Resistance: 450mΩ; RoHS: Yes; ComponentLink1Description: Datasheet; ComponentLink1URL: https://wmsc.lcsc.com/wmsc/upload/file/pdf/v2/lcsc/1811131630_MetalLions-MLB1608-601-F_C29108.pdf; ComponentLink2Description: JLCPCB Part URL; ComponentLink2URL: https://jlcpcb.com/partdetail/C29108; ComponentLink3Description: LCSC Part URL; ComponentLink3URL: https://lcsc.com/product-detail/Ferrite-Beads_Meled-Meled-MLB1608-601F_C29108.html
footprint FB-0603 (0603 (1608M) Ferrite)
pins: 1, 2

## MLB1608F-000T
designator FB?  Impedance @ Frequency: 0Ω@100MHz
Ferrite, 0Ω@100MHz, ±25%, SMD 0603; Manufacturer: Meled; Manufacturer Part Number: MLB1608F-000T; Package Size: 0603; JLCPCB Basic Part: No; JLCPCB Part Number: C2844549; Supplier 1: LCSC; Category: Ferrite Beads; Supplier Part Number 1: C2844549; Tolerance: ±25%; RoHS: Yes; ComponentLink1Description: Datasheet; ComponentLink1URL: https://wmsc.lcsc.com/wmsc/upload/file/pdf/v2/lcsc/2306021142_MetalLions-MLB1608F-000T_C2844549.pdf; ComponentLink2Description: JLCPCB Part URL; ComponentLink2URL: https://jlcpcb.com/partdetail/C2844549; ComponentLink3Description: LCSC Part URL; ComponentLink3URL: https://lcsc.com/product-detail/Ferrite-Beads_MetalLions-MetalLions-MLB1608F-000T_C2844549.html
pins: 1, 2

## MLB1608F-100T
designator FB?  Impedance @ Frequency: 10Ω@100MHz
Ferrite, 10Ω@100MHz, ±25%, SMD 0603; Manufacturer: Meled; Manufacturer Part Number: MLB1608F-100T; Package Size: 0603; JLCPCB Basic Part: No; JLCPCB Part Number: C2844551; Supplier 1: LCSC; Category: Ferrite Beads; Supplier Part Number 1: C2844551; Tolerance: ±25%; RoHS: Yes; ComponentLink1Description: Datasheet; ComponentLink1URL: https://wmsc.lcsc.com/wmsc/upload/file/pdf/v2/lcsc/2306021142_MetalLions-MLB1608F-100T_C2844551.pdf; ComponentLink2Description: JLCPCB Part URL; ComponentLink2URL: https://jlcpcb.com/partdetail/C2844551; ComponentLink3Description: LCSC Part URL; ComponentLink3URL: https://lcsc.com/product-detail/Ferrite-Beads_MetalLions-MetalLions-MLB1608F-100T_C2844551.html
pins: 1, 2

## MLB1608F-102T
designator FB?  Impedance @ Frequency: 1000Ω@100MHz
Ferrite, 1000Ω@100MHz, ±25%, 0.6Ω, 200mA, SMD 0603; Manufacturer: Meled; Manufacturer Part Number: MLB1608F-102T; Package Size: 0603; JLCPCB Basic Part: No; JLCPCB Part Number: C2844570; Supplier 1: LCSC; Category: Ferrite Beads; Supplier Part Number 1: C2844570; Tolerance: ±25%; Rated Current: 200mA; DC Resistance: 0.6Ω; RoHS: Yes; ComponentLink1Description: Datasheet; ComponentLink1URL: https://wmsc.lcsc.com/wmsc/upload/file/pdf/v2/lcsc/2306021143_MetalLions-MLB1608F-102T_C2844570.pdf; ComponentLink2Description: JLCPCB Part URL; ComponentLink2URL: https://jlcpcb.com/partdetail/C2844570; ComponentLink3Description: LCSC Part URL; ComponentLink3URL: https://lcsc.com/product-detail/Ferrite-Beads_MetalLions-MetalLions-MLB1608F-102T_C2844570.html
footprint FB-0603 (0603 (1608M) Ferrite)
pins: 1, 2

## MLB1608F-121T
designator FB?  Impedance @ Frequency: 120Ω@100MHz
Ferrite, 120Ω@100MHz, ±25%, 200mΩ, 300mA, SMD 0603; Manufacturer: Meled; Manufacturer Part Number: MLB1608F-121T; Package Size: 0603; JLCPCB Basic Part: No; JLCPCB Part Number: C2844561; Supplier 1: LCSC; Category: Ferrite Beads; Supplier Part Number 1: C2844561; Tolerance: ±25%; Rated Current: 300mA; DC Resistance: 200mΩ; RoHS: Yes; ComponentLink1Description: Datasheet; ComponentLink1URL: https://wmsc.lcsc.com/wmsc/upload/file/pdf/v2/lcsc/2306021143_MetalLions-MLB1608F-121T_C2844561.pdf; ComponentLink2Description: JLCPCB Part URL; ComponentLink2URL: https://jlcpcb.com/partdetail/C2844561; ComponentLink3Description: LCSC Part URL; ComponentLink3URL: https://lcsc.com/product-detail/Ferrite-Beads_MetalLions-MetalLions-MLB1608F-121T_C2844561.html
footprint FB-0603 (0603 (1608M) Ferrite)
pins: 1, 2

## MLB1608F-152T
designator FB?  Impedance @ Frequency: 1500Ω@100MHz
Ferrite, 1500Ω@100MHz, ±25%, 0.85Ω, 100mA, SMD 0603; Manufacturer: Meled; Manufacturer Part Number: MLB1608F-152T; Package Size: 0603; JLCPCB Basic Part: No; JLCPCB Part Number: C2844572; Supplier 1: LCSC; Category: Ferrite Beads; Supplier Part Number 1: C2844572; Tolerance: ±25%; Rated Current: 100mA; DC Resistance: 0.85Ω; RoHS: Yes; ComponentLink1Description: Datasheet; ComponentLink1URL: https://wmsc.lcsc.com/wmsc/upload/file/pdf/v2/lcsc/2306021143_MetalLions-MLB1608F-152T_C2844572.pdf; ComponentLink2Description: JLCPCB Part URL; ComponentLink2URL: https://jlcpcb.com/partdetail/C2844572; ComponentLink3Description: LCSC Part URL; ComponentLink3URL: https://lcsc.com/product-detail/Ferrite-Beads_MetalLions-MetalLions-MLB1608F-152T_C2844572.html
footprint FB-0603 (0603 (1608M) Ferrite)
pins: 1, 2

## MLB1608F-182T
designator FB?  Impedance @ Frequency: 1.8kΩ@100MHz
Ferrite, 1.8kΩ@100MHz, ±25%, 1.1Ω, 50mA, SMD 0603; Manufacturer: Meled; Manufacturer Part Number: MLB1608F-182T; Package Size: 0603; JLCPCB Basic Part: No; JLCPCB Part Number: C2844573; Supplier 1: LCSC; Category: Ferrite Beads; Supplier Part Number 1: C2844573; Tolerance: ±25%; Rated Current: 50mA; DC Resistance: 1.1Ω; RoHS: Yes; ComponentLink1Description: Datasheet; ComponentLink1URL: https://wmsc.lcsc.com/wmsc/upload/file/pdf/v2/lcsc/2306021143_MetalLions-MLB1608F-182T_C2844573.pdf; ComponentLink2Description: JLCPCB Part URL; ComponentLink2URL: https://jlcpcb.com/partdetail/C2844573; ComponentLink3Description: LCSC Part URL; ComponentLink3URL: https://lcsc.com/product-detail/Ferrite-Beads_MetalLions-MetalLions-MLB1608F-182T_C2844573.html
footprint FB-0603 (0603 (1608M) Ferrite)
pins: 1, 2

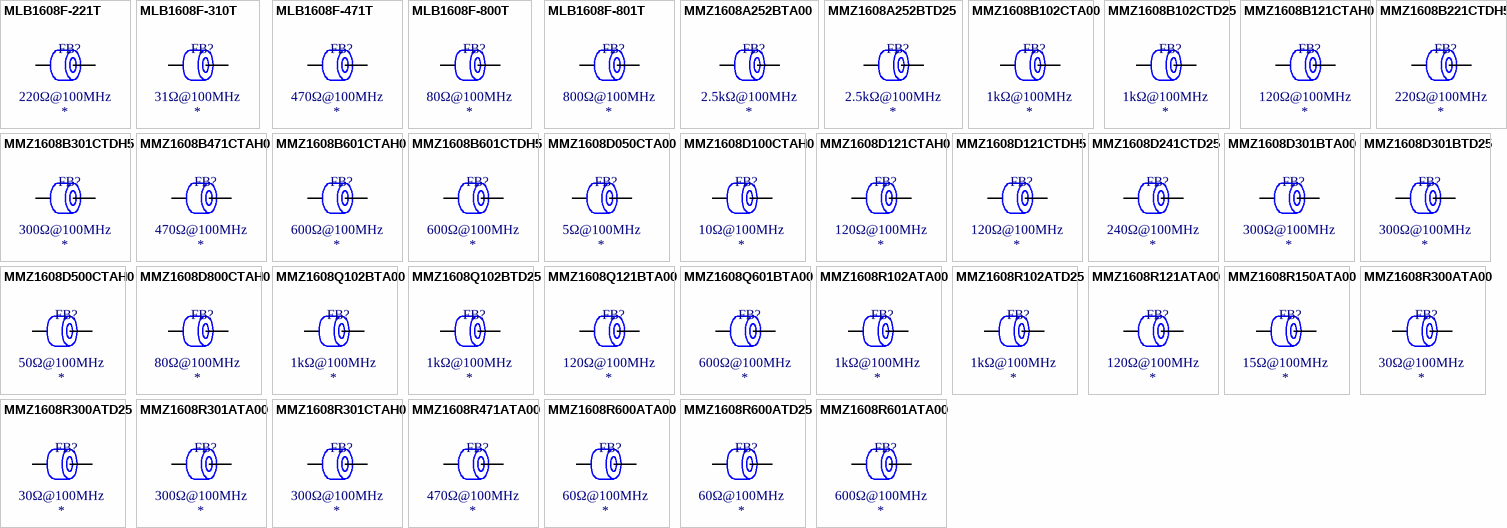
[diagram p14: symbols MLB1608F-221T to MMZ1608R601ATA00]

## MLB1608F-221T
designator FB?  Impedance @ Frequency: 220Ω@100MHz
Ferrite, 220Ω@100MHz, ±25%, 300mΩ, 300mA, SMD 0603; Manufacturer: Meled; Manufacturer Part Number: MLB1608F-221T; Package Size: 0603; JLCPCB Basic Part: No; JLCPCB Part Number: C2844563; Supplier 1: LCSC; Category: Ferrite Beads; Supplier Part Number 1: C2844563; Tolerance: ±25%; Rated Current: 300mA; DC Resistance: 300mΩ; RoHS: Yes; ComponentLink1Description: Datasheet; ComponentLink1URL: https://wmsc.lcsc.com/wmsc/upload/file/pdf/v2/lcsc/2306021143_MetalLions-MLB1608F-221T_C2844563.pdf; ComponentLink2Description: JLCPCB Part URL; ComponentLink2URL: https://jlcpcb.com/partdetail/C2844563; ComponentLink3Description: LCSC Part URL; ComponentLink3URL: https://lcsc.com/product-detail/Ferrite-Beads_MetalLions-MetalLions-MLB1608F-221T_C2844563.html
footprint FB-0603 (0603 (1608M) Ferrite)
pins: 1, 2

## MLB1608F-310T
designator FB?  Impedance @ Frequency: 31Ω@100MHz
Ferrite, 31Ω@100MHz, ±25%, SMD 0603; Manufacturer: Meled; Manufacturer Part Number: MLB1608F-310T; Package Size: 0603; JLCPCB Basic Part: No; JLCPCB Part Number: C2844554; Supplier 1: LCSC; Category: Ferrite Beads; Supplier Part Number 1: C2844554; Tolerance: ±25%; RoHS: Yes; ComponentLink1Description: Datasheet; ComponentLink1URL: https://wmsc.lcsc.com/wmsc/upload/file/pdf/v2/lcsc/2306021142_MetalLions-MLB1608F-310T_C2844554.pdf; ComponentLink2Description: JLCPCB Part URL; ComponentLink2URL: https://jlcpcb.com/partdetail/C2844554; ComponentLink3Description: LCSC Part URL; ComponentLink3URL: https://lcsc.com/product-detail/Ferrite-Beads_MetalLions-MetalLions-MLB1608F-310T_C2844554.html
pins: 1, 2

## MLB1608F-471T
designator FB?  Impedance @ Frequency: 470Ω@100MHz
Ferrite, 470Ω@100MHz, ±25%, SMD 0603; Manufacturer: Meled; Manufacturer Part Number: MLB1608F-471T; Package Size: 0603; JLCPCB Basic Part: No; JLCPCB Part Number: C2844566; Supplier 1: LCSC; Category: Ferrite Beads; Supplier Part Number 1: C2844566; Tolerance: ±25%; RoHS: Yes; ComponentLink1Description: Datasheet; ComponentLink1URL: https://wmsc.lcsc.com/wmsc/upload/file/pdf/v2/lcsc/2306021143_MetalLions-MLB1608F-471T_C2844566.pdf; ComponentLink2Description: JLCPCB Part URL; ComponentLink2URL: https://jlcpcb.com/partdetail/C2844566; ComponentLink3Description: LCSC Part URL; ComponentLink3URL: https://lcsc.com/product-detail/Ferrite-Beads_Meled-Meled-MLB1608F-471T_C2844566.html
pins: 1, 2

## MLB1608F-800T
designator FB?  Impedance @ Frequency: 80Ω@100MHz
Ferrite, 80Ω@100MHz, ±25%, 200mΩ, 300mA, SMD 0603; Manufacturer: Meled; Manufacturer Part Number: MLB1608F-800T; Package Size: 0603; JLCPCB Basic Part: No; JLCPCB Part Number: C2844558; Supplier 1: LCSC; Category: Ferrite Beads; Supplier Part Number 1: C2844558; Tolerance: ±25%; Rated Current: 300mA; DC Resistance: 200mΩ; RoHS: Yes; ComponentLink1Description: Datasheet; ComponentLink1URL: https://wmsc.lcsc.com/wmsc/upload/file/pdf/v2/lcsc/2306021143_MetalLions-MLB1608F-800T_C2844558.pdf; ComponentLink2Description: JLCPCB Part URL; ComponentLink2URL: https://jlcpcb.com/partdetail/C2844558; ComponentLink3Description: LCSC Part URL; ComponentLink3URL: https://lcsc.com/product-detail/Ferrite-Beads_MetalLions-MetalLions-MLB1608F-800T_C2844558.html
footprint FB-0603 (0603 (1608M) Ferrite)
pins: 1, 2

## MLB1608F-801T
designator FB?  Impedance @ Frequency: 800Ω@100MHz
Ferrite, 800Ω@100MHz, ±25%, 0.6Ω, 200mA, SMD 0603; Manufacturer: Meled; Manufacturer Part Number: MLB1608F-801T; Package Size: 0603; JLCPCB Basic Part: No; JLCPCB Part Number: C2844569; Supplier 1: LCSC; Category: Ferrite Beads; Supplier Part Number 1: C2844569; Tolerance: ±25%; Rated Current: 200mA; DC Resistance: 0.6Ω; RoHS: Yes; ComponentLink1Description: Datasheet; ComponentLink1URL: https://wmsc.lcsc.com/wmsc/upload/file/pdf/v2/lcsc/2306021143_MetalLions-MLB1608F-801T_C2844569.pdf; ComponentLink2Description: JLCPCB Part URL; ComponentLink2URL: https://jlcpcb.com/partdetail/C2844569; ComponentLink3Description: LCSC Part URL; ComponentLink3URL: https://lcsc.com/product-detail/Ferrite-Beads_MetalLions-MetalLions-MLB1608F-801T_C2844569.html
footprint FB-0603 (0603 (1608M) Ferrite)
pins: 1, 2

## MMZ1608A252BTA00
designator FB?  Impedance @ Frequency: 2.5kΩ@100MHz
Ferrite, 2.5kΩ@100MHz, ±25%, 800mΩ, 200mA, SMD 0603; Manufacturer: TDK; Manufacturer Part Number: MMZ1608A252BTA00; Package Size: 0603; JLCPCB Basic Part: No; JLCPCB Part Number: C275434; Supplier 1: LCSC; Category: Ferrite Beads; Supplier Part Number 1: C275434; Tolerance: ±25%; Rated Current: 200mA; DC Resistance: 800mΩ; RoHS: Yes; ComponentLink1Description: Datasheet; ComponentLink1URL: https://wmsc.lcsc.com/wmsc/upload/file/pdf/v2/lcsc/2304140030_TDK-MMZ1608A252BTA00_C275434.pdf; ComponentLink2Description: JLCPCB Part URL; ComponentLink2URL: https://jlcpcb.com/partdetail/C275434; ComponentLink3Description: LCSC Part URL; ComponentLink3URL: https://lcsc.com/product-detail/Ferrite-Beads_TDK-TDK-MMZ1608A252BTA00_C275434.html
footprint FB-0603 (0603 (1608M) Ferrite)
pins: 1, 2

## MMZ1608A252BTD25
designator FB?  Impedance @ Frequency: 2.5kΩ@100MHz
Ferrite, 2.5kΩ@100MHz, ±25%, 800mΩ, 200mA, SMD 0603; Manufacturer: TDK; Manufacturer Part Number: MMZ1608A252BTD25; Package Size: 0603; JLCPCB Basic Part: No; JLCPCB Part Number: C518886; Supplier 1: LCSC; Category: Ferrite Beads; Supplier Part Number 1: C518886; Tolerance: ±25%; Rated Current: 200mA; DC Resistance: 800mΩ; RoHS: Yes; ComponentLink1Description: Datasheet; ComponentLink1URL: https://wmsc.lcsc.com/wmsc/upload/file/pdf/v2/lcsc/2304140030_TDK-MMZ1608A252BTD25_C518886.pdf; ComponentLink2Description: JLCPCB Part URL; ComponentLink2URL: https://jlcpcb.com/partdetail/C518886; ComponentLink3Description: LCSC Part URL; ComponentLink3URL: https://lcsc.com/product-detail/Ferrite-Beads_TDK-TDK-MMZ1608A252BTD25_C518886.html
footprint FB-0603 (0603 (1608M) Ferrite)
pins: 1, 2

## MMZ1608B102CTA00
designator FB?  Impedance @ Frequency: 1kΩ@100MHz
Ferrite, 1kΩ@100MHz, ±25%, 600mΩ, 300mA, SMD 0603; Manufacturer: TDK; Manufacturer Part Number: MMZ1608B102CTA00; Package Size: 0603; JLCPCB Basic Part: No; JLCPCB Part Number: C275435; Supplier 1: LCSC; Category: Ferrite Beads; Supplier Part Number 1: C275435; Tolerance: ±25%; Rated Current: 300mA; DC Resistance: 600mΩ; RoHS: Yes; ComponentLink1Description: Datasheet; ComponentLink1URL: https://wmsc.lcsc.com/wmsc/upload/file/pdf/v2/lcsc/2304140030_TDK-MMZ1608B102CTA00_C275435.pdf; ComponentLink2Description: JLCPCB Part URL; ComponentLink2URL: https://jlcpcb.com/partdetail/C275435; ComponentLink3Description: LCSC Part URL; ComponentLink3URL: https://lcsc.com/product-detail/Ferrite-Beads_TDK-TDK-MMZ1608B102CTA00_C275435.html
footprint FB-0603 (0603 (1608M) Ferrite)
pins: 1, 2

## MMZ1608B102CTD25
designator FB?  Impedance @ Frequency: 1kΩ@100MHz
Ferrite, 1kΩ@100MHz, ±25%, 600mΩ, 300mA, SMD 0603; Manufacturer: TDK; Manufacturer Part Number: MMZ1608B102CTD25; Package Size: 0603; JLCPCB Basic Part: No; JLCPCB Part Number: C307758; Supplier 1: LCSC; Category: Ferrite Beads; Supplier Part Number 1: C307758; Tolerance: ±25%; Rated Current: 300mA; DC Resistance: 600mΩ; RoHS: Yes; ComponentLink1Description: Datasheet; ComponentLink1URL: https://wmsc.lcsc.com/wmsc/upload/file/pdf/v2/lcsc/2304140030_TDK-MMZ1608B102CTD25_C307758.pdf; ComponentLink2Description: JLCPCB Part URL; ComponentLink2URL: https://jlcpcb.com/partdetail/C307758; ComponentLink3Description: LCSC Part URL; ComponentLink3URL: https://lcsc.com/product-detail/Ferrite-Beads_TDK-TDK-MMZ1608B102CTD25_C307758.html
footprint FB-0603 (0603 (1608M) Ferrite)
pins: 1, 2

## MMZ1608B121CTAH0
designator FB?  Impedance @ Frequency: 120Ω@100MHz
Ferrite, 120Ω@100MHz, ±25%, 150mΩ, 600mA, SMD 0603; Manufacturer: TDK; Manufacturer Part Number: MMZ1608B121CTAH0; Package Size: 0603; JLCPCB Basic Part: No; JLCPCB Part Number: C275436; Supplier 1: LCSC; Category: Ferrite Beads; Supplier Part Number 1: C275436; Tolerance: ±25%; Rated Current: 600mA; DC Resistance: 150mΩ; RoHS: Yes; ComponentLink1Description: Datasheet; ComponentLink1URL: https://wmsc.lcsc.com/wmsc/upload/file/pdf/v2/lcsc/2304140030_TDK-MMZ1608B121CTAH0_C275436.pdf; ComponentLink2Description: JLCPCB Part URL; ComponentLink2URL: https://jlcpcb.com/partdetail/C275436; ComponentLink3Description: LCSC Part URL; ComponentLink3URL: https://lcsc.com/product-detail/Ferrite-Beads_TDK-TDK-MMZ1608B121CTAH0_C275436.html
footprint FB-0603 (0603 (1608M) Ferrite)
pins: 1, 2

## MMZ1608B221CTDH5
designator FB?  Impedance @ Frequency: 220Ω@100MHz
Ferrite, 220Ω@100MHz, ±25%, 250mΩ, 500mA, SMD 0603; Manufacturer: TDK; Manufacturer Part Number: MMZ1608B221CTDH5; Package Size: 0603; JLCPCB Basic Part: No; JLCPCB Part Number: C2661660; Supplier 1: LCSC; Category: Ferrite Beads; Supplier Part Number 1: C2661660; Tolerance: ±25%; Rated Current: 500mA; DC Resistance: 250mΩ; RoHS: Yes; ComponentLink1Description: Datasheet; ComponentLink1URL: https://wmsc.lcsc.com/wmsc/upload/file/pdf/v2/lcsc/2304140030_TDK-MMZ1608B221CTDH5_C2661660.pdf; ComponentLink2Description: JLCPCB Part URL; ComponentLink2URL: https://jlcpcb.com/partdetail/C2661660; ComponentLink3Description: LCSC Part URL; ComponentLink3URL: https://lcsc.com/product-detail/Ferrite-Beads_TDK-TDK-MMZ1608B221CTDH5_C2661660.html
footprint FB-0603 (0603 (1608M) Ferrite)
pins: 1, 2
